# Altium footprint library ICs And Semiconductors THD.PcbLib: 350 footprints (part 3 of 22)
Each footprint in its own frame and in the unit in brackets; x right, y up, seen from the top. Pads: shape width x height; smd on the part's side, far side on the other; paste and mask are expansions set on the pad; w line width, h text height; cw(c..) or ccw(c..) is an arc to the next point about the centre after c.
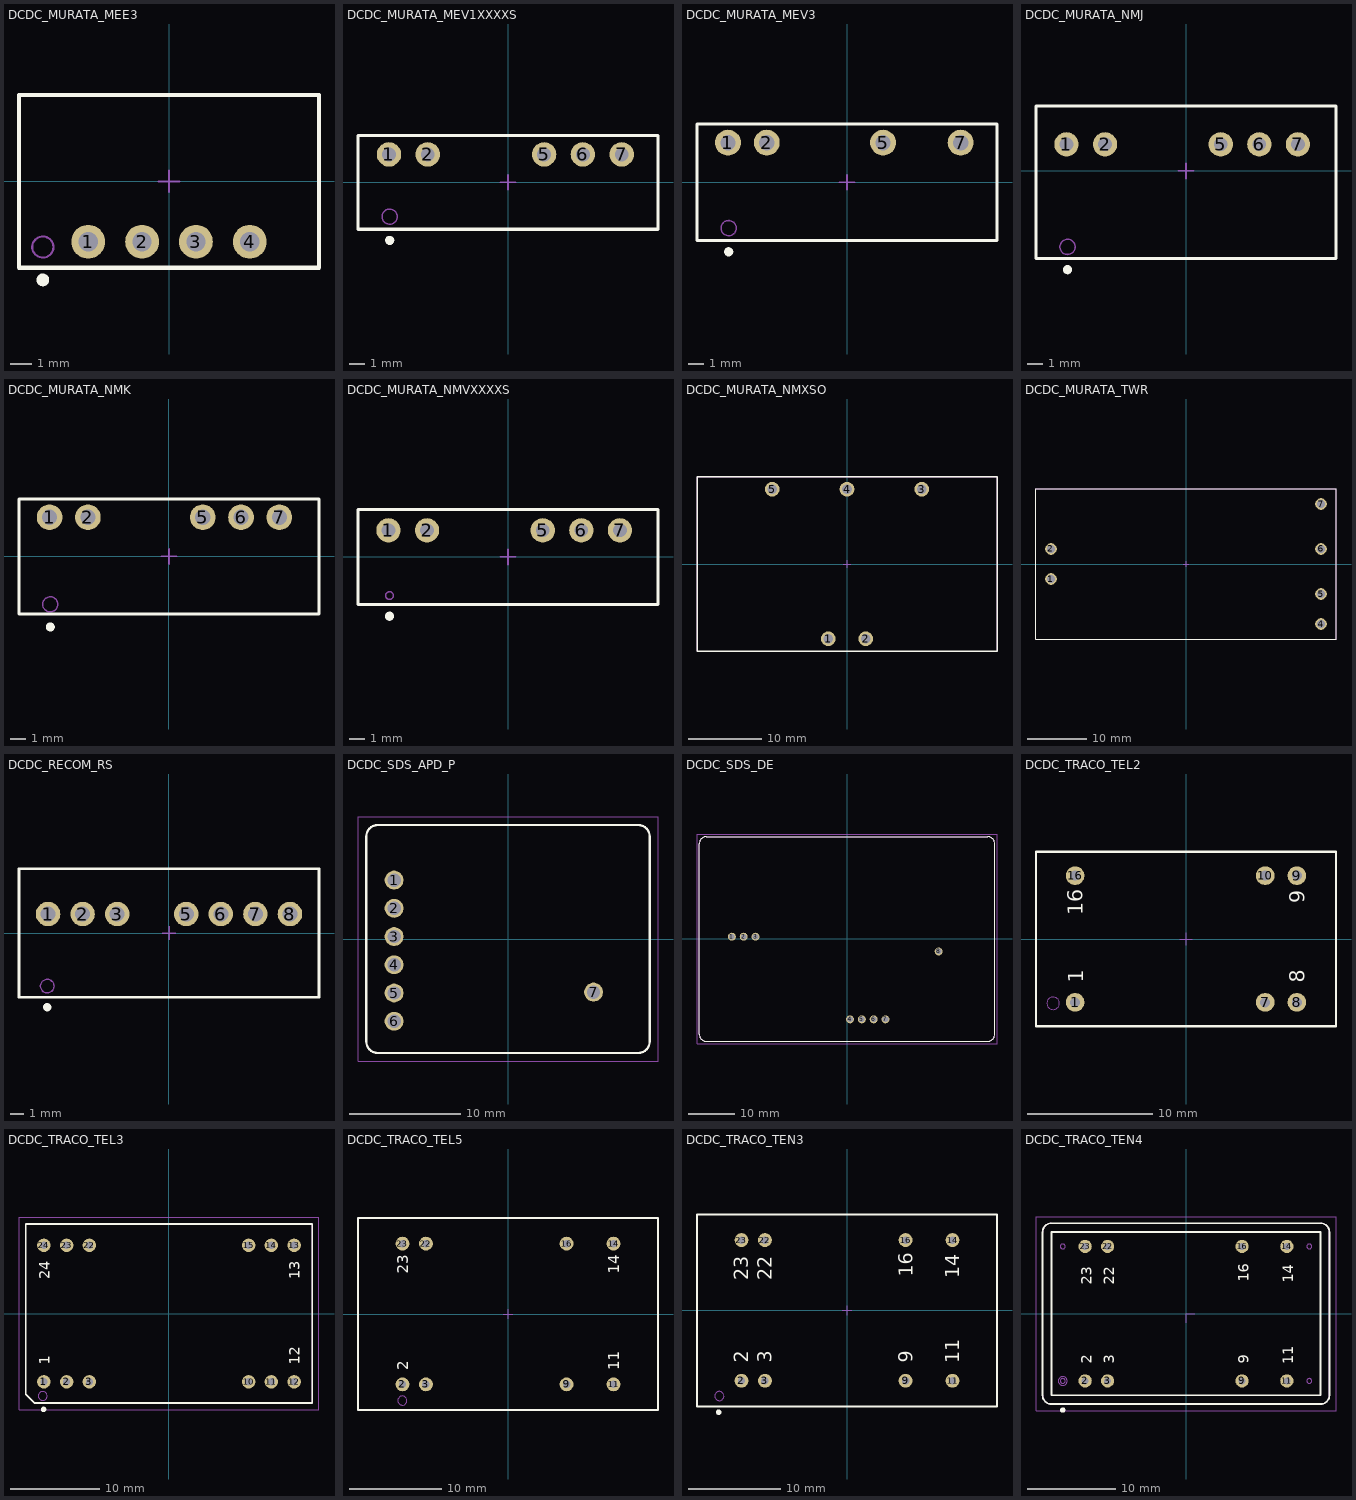
[diagram p2: the footprints below, top view; thin cyan lines are the x and y axes]

## DCDC_MURATA_MEE3 [mm] "MEE3 Series , Body 14.15 x 8.15mm, SIP Package"
height 10.15
pads (4):
  round 1.6 hole 0.9: 1(-3.81,-2.85) 2(-1.27,-2.85) 3(1.27,-2.85) 4(3.81,-2.85)
Top Overlay:
  circle w0.3: c-5.95,-4.65 r0.15
  lines w0.2: -7.075,-4.075 -7.075,4.075 7.075,4.075 7.075,-4.075 -7.075,-4.075
Notvisible:
  lines w0.1: -4.31,-2.85 -3.81,-2.85 ; -3.81,-3.35 -3.81,-2.85 ; -3.81,-2.35 -3.81,-2.85 ; -3.31,-2.85 -3.81,-2.85 ; -1.77,-2.85 -1.27,-2.85 ; -1.27,-3.35 -1.27,-2.85 ; -1.27,-2.35 -1.27,-2.85 ; -0.77,-2.85 -1.27,-2.85 ; -0.5,0 0,0 ; 0,-0.5 0,0 ; 0,0.5 0,0 ; 0.5,0 0,0 ; 0.77,-2.85 1.27,-2.85 ; 1.27,-3.35 1.27,-2.85 ; 1.27,-2.35 1.27,-2.85 ; 1.77,-2.85 1.27,-2.85 ; 3.31,-2.85 3.81,-2.85 ; 3.81,-3.35 3.81,-2.85 ; 3.81,-2.35 3.81,-2.85 ; 4.31,-2.85 3.81,-2.85
Mechanical 14:
  circle w0.1: c-5.95,-3.1 r0.5
  lines w0.1: -7.075,-4.075 -7.075,4.075 7.075,4.075 7.075,-4.075 -7.075,-4.075
3D body "DCDC_MURATA_MEE3.stp": height 10.25, standoff -3.2, extent -7.075,-4.075 7.075,4.075

## DCDC_MURATA_MEV1XXXXS [mm] "MEV1 Series , Body 19.65 x 6.15mm, SIP-7"
height 10.15
pads (5):
  round 1.6 hole 0.9: 1(-7.795,1.825) 2(-5.255,1.825) 5(2.365,1.825) 6(4.905,1.825) 7(7.445,1.825)
Top Overlay:
  circle w0.3: c-7.75,-3.8 r0.15
  lines w0.2: -9.825,-3.075 9.825,-3.075 9.825,3.075 -9.825,3.075 -9.825,-3.075
Notvisible:
  lines w0.1: -8.295,1.825 -7.795,1.825 ; -7.795,1.325 -7.795,1.825 ; -7.795,2.325 -7.795,1.825 ; -7.295,1.825 -7.795,1.825 ; -5.755,1.825 -5.255,1.825 ; -5.255,1.325 -5.255,1.825 ; -5.255,2.325 -5.255,1.825 ; -4.755,1.825 -5.255,1.825 ; -0.5,0 0,0 ; 0,-0.5 0,0 ; 0,0.5 0,0 ; 0.5,0 0,0 ; 1.865,1.825 2.365,1.825 ; 2.365,1.325 2.365,1.825 ; 2.365,2.325 2.365,1.825 ; 2.865,1.825 2.365,1.825 ; 4.405,1.825 4.905,1.825 ; 4.905,1.325 4.905,1.825 ; 4.905,2.325 4.905,1.825 ; 5.405,1.825 4.905,1.825 ; 6.945,1.825 7.445,1.825 ; 7.445,1.325 7.445,1.825 ; 7.445,2.325 7.445,1.825 ; 7.945,1.825 7.445,1.825
Mechanical 14:
  circle w0.1: c-7.75,-2.25 r0.5
  lines w0.1: -9.825,-3.075 9.825,-3.075 9.825,3.075 -9.825,3.075 -9.825,-3.075
3D body "DCDC_MURATA_MEV1XXXXS.stp": height 10.15, standoff -3.6, extent -9.825,-3.075 9.825,3.075

## DCDC_MURATA_MEV3 [mm] "MEV3S Series , Body 19.65 x 7.65mm, SIP-7"
height 10.15
pads (4):
  round 1.7 hole 1: 1(-7.795,2.6) 2(-5.255,2.6) 5(2.365,2.6) 7(7.445,2.6)
Top Overlay:
  circle w0.3: c-7.75,-4.55 r0.15
  lines w0.2: -9.825,-3.825 -9.825,3.825 9.825,3.825 9.825,-3.825 -9.825,-3.825
Notvisible:
  lines w0.1: -8.295,2.6 -7.795,2.6 ; -7.795,2.1 -7.795,2.6 ; -7.795,3.1 -7.795,2.6 ; -7.295,2.6 -7.795,2.6 ; -5.755,2.6 -5.255,2.6 ; -5.255,2.1 -5.255,2.6 ; -5.255,3.1 -5.255,2.6 ; -4.755,2.6 -5.255,2.6 ; -0.5,0 0,0 ; 0,-0.5 0,0 ; 0,0.5 0,0 ; 0.5,0 0,0 ; 1.865,2.6 2.365,2.6 ; 2.365,2.1 2.365,2.6 ; 2.365,3.1 2.365,2.6 ; 2.865,2.6 2.365,2.6 ; 6.945,2.6 7.445,2.6 ; 7.445,2.1 7.445,2.6 ; 7.445,3.1 7.445,2.6 ; 7.945,2.6 7.445,2.6
Mechanical 14:
  circle w0.1: c-7.75,-3 r0.5
  lines w0.1: -9.825,-3.825 -9.825,3.825 9.825,3.825 9.825,-3.825 -9.825,-3.825
3D body "DCDC_MURATA_MEV3.stp": height 10.15, standoff -3.6, extent -9.825,-3.825 9.825,3.825

## DCDC_MURATA_NMJ [mm] "NMJ Series , Body 19.5 x 9.8mm, SIP-7"
height 12.5
pads (5):
  round 1.6 hole 0.9: 1(-7.87,1.75) 2(-5.33,1.75) 5(2.29,1.75) 6(4.83,1.75) 7(7.37,1.75)
Top Overlay:
  circle w0.3: c-7.8,-6.5 r0.15
  lines w0.2: -9.875,-5.775 9.875,-5.775 9.875,4.275 -9.875,4.275 -9.875,-5.775
Notvisible:
  lines w0.1: -8.37,1.75 -7.87,1.75 ; -7.87,1.25 -7.87,1.75 ; -7.87,2.25 -7.87,1.75 ; -7.37,1.75 -7.87,1.75 ; -5.83,1.75 -5.33,1.75 ; -5.33,1.25 -5.33,1.75 ; -5.33,2.25 -5.33,1.75 ; -4.83,1.75 -5.33,1.75 ; -0.5,0 0,0 ; 0,-0.5 0,0 ; 0,0.5 0,0 ; 0.5,0 0,0 ; 1.79,1.75 2.29,1.75 ; 2.29,1.25 2.29,1.75 ; 2.29,2.25 2.29,1.75 ; 2.79,1.75 2.29,1.75 ; 4.33,1.75 4.83,1.75 ; 4.83,1.25 4.83,1.75 ; 4.83,2.25 4.83,1.75 ; 5.33,1.75 4.83,1.75 ; 6.87,1.75 7.37,1.75 ; 7.37,1.25 7.37,1.75 ; 7.37,2.25 7.37,1.75 ; 7.87,1.75 7.37,1.75
Mechanical 14:
  circle w0.1: c-7.8,-5 r0.5
  lines w0.1: -9.875,-5.775 9.875,-5.775 9.875,4.275 -9.875,4.275 -9.875,-5.775
3D body "DCDC_MURATA_NMJ.stp": height 12.75, standoff -3.75, extent -9.875,-5.775 9.875,4.275

## DCDC_MURATA_NMK [mm] "NMK Series , Body 19.65 x 7.65mm, SIP-7"
height 10.15
pads (5):
  round 1.7 hole 1: 1(-7.92,2.6) 2(-5.38,2.6) 5(2.24,2.6) 6(4.78,2.6) 7(7.32,2.6)
Top Overlay:
  circle w0.3: c-7.875,-4.675 r0.15
  lines w0.2: -9.95,-3.825 9.95,-3.825 9.95,3.825 -9.95,3.825 -9.95,-3.825
Notvisible:
  lines w0.1: -8.42,2.6 -7.92,2.6 ; -7.92,2.1 -7.92,2.6 ; -7.92,3.1 -7.92,2.6 ; -7.42,2.6 -7.92,2.6 ; -5.88,2.6 -5.38,2.6 ; -5.38,2.1 -5.38,2.6 ; -5.38,3.1 -5.38,2.6 ; -4.88,2.6 -5.38,2.6 ; -0.5,0 0,0 ; 0,-0.5 0,0 ; 0,0.5 0,0 ; 0.5,0 0,0 ; 1.74,2.6 2.24,2.6 ; 2.24,2.1 2.24,2.6 ; 2.24,3.1 2.24,2.6 ; 2.74,2.6 2.24,2.6 ; 4.28,2.6 4.78,2.6 ; 4.78,2.1 4.78,2.6 ; 4.78,3.1 4.78,2.6 ; 5.28,2.6 4.78,2.6 ; 6.82,2.6 7.32,2.6 ; 7.32,2.1 7.32,2.6 ; 7.32,3.1 7.32,2.6 ; 7.82,2.6 7.32,2.6
Mechanical 14:
  circle w0.1: c-7.875,-3.175 r0.5
  lines w0.1: -9.95,-3.825 9.95,-3.825 9.95,3.825 -9.95,3.825 -9.95,-3.825
3D body "DCDC_MURATA_NMK.stp": height 10.15, standoff -3.6, extent -9.95,-3.825 9.95,3.825

## DCDC_MURATA_NMVXXXXS [mm] "NMV Series , Body 19.5 x 6mm, SIP-7"
height 10.25
pads (5):
  round 1.6 hole 0.9: 1(-7.87,1.75) 2(-5.33,1.75) 5(2.29,1.75) 6(4.83,1.75) 7(7.37,1.75)
Top Overlay:
  circle w0.3: c-7.8,-3.9 r0.15
  lines w0.2: -9.875,-3.125 -9.875,3.125 9.875,3.125 9.875,-3.125 -9.875,-3.125
Notvisible:
  lines w0.1: -8.37,1.75 -7.87,1.75 ; -7.87,1.25 -7.87,1.75 ; -7.87,2.25 -7.87,1.75 ; -7.37,1.75 -7.87,1.75 ; -5.83,1.75 -5.33,1.75 ; -5.33,1.25 -5.33,1.75 ; -5.33,2.25 -5.33,1.75 ; -4.83,1.75 -5.33,1.75 ; -0.5,0 0,0 ; 0,-0.5 0,0 ; 0,0.5 0,0 ; 0.5,0 0,0 ; 1.79,1.75 2.29,1.75 ; 2.29,1.25 2.29,1.75 ; 2.29,2.25 2.29,1.75 ; 2.79,1.75 2.29,1.75 ; 4.33,1.75 4.83,1.75 ; 4.83,1.25 4.83,1.75 ; 4.83,2.25 4.83,1.75 ; 5.33,1.75 4.83,1.75 ; 6.87,1.75 7.37,1.75 ; 7.37,1.25 7.37,1.75 ; 7.37,2.25 7.37,1.75 ; 7.87,1.75 7.37,1.75
Mechanical 14:
  circle w0.1: c-7.8,-2.54 r0.254
  lines w0.1: -9.875,-3.125 9.875,-3.125 9.875,3.125 -9.875,3.125 -9.875,-3.125
3D body "DCDC_MURATA_NMVXXXXS.stp": height 10.25, standoff -3.75, extent -9.875,-3.125 9.875,3.125

## DCDC_MURATA_NMXSO [mm] "NMXSO Series , Body 40.5x23.5mm, Height 10mm"
height 10.25
pads (5):
  round 2 hole 1.3: 1(-2.54,-10.16) 2(2.54,-10.16) 3(10.16,10.16) 4(0,10.16) 5(-10.16,10.16)
Top Overlay:
  lines w0.2: -20.375,-11.875 -20.375,11.875 20.375,11.875 20.375,-11.875 -20.375,-11.875
Notvisible:
  lines w0.1: -10.66,10.16 -10.16,10.16 ; -10.16,9.66 -10.16,10.16 ; -10.16,10.66 -10.16,10.16 ; -9.66,10.16 -10.16,10.16 ; -3.04,-10.16 -2.54,-10.16 ; -2.54,-10.66 -2.54,-10.16 ; -2.54,-9.66 -2.54,-10.16 ; -2.04,-10.16 -2.54,-10.16 ; -0.5,0 0,0 ; -0.5,10.16 0,10.16 ; 0,-0.5 0,0 ; 0,0.5 0,0 ; 0,9.66 0,10.16 ; 0,10.66 0,10.16 ; 0.5,0 0,0 ; 0.5,10.16 0,10.16 ; 2.04,-10.16 2.54,-10.16 ; 2.54,-10.66 2.54,-10.16 ; 2.54,-9.66 2.54,-10.16 ; 3.04,-10.16 2.54,-10.16 ; 9.66,10.16 10.16,10.16 ; 10.16,9.66 10.16,10.16 ; 10.16,10.66 10.16,10.16 ; 10.66,10.16 10.16,10.16
Mechanical 14:
  lines w0.1: -20.375,-11.875 -20.375,11.875 20.375,11.875 20.375,-11.875 -20.375,-11.875
3D body "DCDC_MURATA_NMXSO.stp": height 10.25, standoff -3.5, extent -20.375,-11.875 20.375,11.875

## DCDC_MURATA_TWR [mm] "TWR Series , Body 50.08 x 25.4mm, Height 9.53mm"
height 9.53
pads (6):
  round 2 hole 1.3: 1(-22.86,-2.54) 2(-22.86,2.54) 4(22.86,-10.16) 5(22.86,-5.08) 6(22.86,2.54) 7(22.86,10.16)
Top Overlay:
  lines w0.2: -25.4,-12.7 -25.4,12.7 25.4,12.7 25.4,-12.7 -25.4,-12.7
Notvisible:
  lines w0.1: -23.36,-2.54 -22.86,-2.54 ; -23.36,2.54 -22.86,2.54 ; -22.86,-3.04 -22.86,-2.54 ; -22.86,-2.04 -22.86,-2.54 ; -22.86,2.04 -22.86,2.54 ; -22.86,3.04 -22.86,2.54 ; -22.36,-2.54 -22.86,-2.54 ; -22.36,2.54 -22.86,2.54 ; -0.5,0 0,0 ; 0,-0.5 0,0 ; 0,0.5 0,0 ; 0.5,0 0,0 ; 22.36,-10.16 22.86,-10.16 ; 22.36,-5.08 22.86,-5.08 ; 22.36,2.54 22.86,2.54 ; 22.36,10.16 22.86,10.16 ; 22.86,-10.66 22.86,-10.16 ; 22.86,-9.66 22.86,-10.16 ; 22.86,-5.58 22.86,-5.08 ; 22.86,-4.58 22.86,-5.08 ; 22.86,2.04 22.86,2.54 ; 22.86,3.04 22.86,2.54 ; 22.86,9.66 22.86,10.16 ; 22.86,10.66 22.86,10.16 ; 23.36,-10.16 22.86,-10.16 ; 23.36,-5.08 22.86,-5.08 ; 23.36,2.54 22.86,2.54 ; 23.36,10.16 22.86,10.16
Mechanical 14:
  lines w0.1: -25.4,-12.7 -25.4,12.7 25.4,12.7 25.4,-12.7 -25.4,-12.7
3D body "DC-DC_MURATA_TWR.stp": height 9.53, standoff -3.8, extent -25.4,-12.7 25.4,12.7

## DCDC_RECOM_RS [mm] "RS Series , Body 21.8x9.2mm, Compact SIP-8 Package"
height 11.35
pads (7):
  round 1.8 hole 1.1: 1(-8.89,1.4) 2(-6.35,1.4) 3(-3.81,1.4) 5(1.27,1.4) 6(3.81,1.4) 7(6.35,1.4) 8(8.89,1.4)
Top Overlay:
  circle w0.3: c-8.95,-5.45 r0.15
  lines w0.2: -11.025,-4.725 -11.025,4.725 11.025,4.725 11.025,-4.725 -11.025,-4.725
Notvisible:
  lines w0.1: -9.39,1.4 -8.89,1.4 ; -8.89,0.9 -8.89,1.4 ; -8.89,1.9 -8.89,1.4 ; -8.39,1.4 -8.89,1.4 ; -6.85,1.4 -6.35,1.4 ; -6.35,0.9 -6.35,1.4 ; -6.35,1.9 -6.35,1.4 ; -5.85,1.4 -6.35,1.4 ; -4.31,1.4 -3.81,1.4 ; -3.81,0.9 -3.81,1.4 ; -3.81,1.9 -3.81,1.4 ; -3.31,1.4 -3.81,1.4 ; -0.5,0 0,0 ; 0,-0.5 0,0 ; 0,0.5 0,0 ; 0.5,0 0,0 ; 0.77,1.4 1.27,1.4 ; 1.27,0.9 1.27,1.4 ; 1.27,1.9 1.27,1.4 ; 1.77,1.4 1.27,1.4 ; 3.31,1.4 3.81,1.4 ; 3.81,0.9 3.81,1.4 ; 3.81,1.9 3.81,1.4 ; 4.31,1.4 3.81,1.4 ; 5.85,1.4 6.35,1.4 ; 6.35,0.9 6.35,1.4 ; 6.35,1.9 6.35,1.4 ; 6.85,1.4 6.35,1.4 ; 8.39,1.4 8.89,1.4 ; 8.89,0.9 8.89,1.4 ; 8.89,1.9 8.89,1.4 ; 9.39,1.4 8.89,1.4
Mechanical 14:
  circle w0.1: c-8.95,-3.9 r0.5
  lines w0.1: -11.025,-4.725 -11.025,4.725 11.025,4.725 11.025,-4.725 -11.025,-4.725
3D body "DCDC_RECOM_RS.stp": height 11.35, standoff -3.6, extent -11.025,-4.725 11.025,4.725

## DCDC_SDS_APD_P [mm] "ADP Series , Body 25.5x20.5mm, high voltage DC-DC converter"
height 11
pads (7):
  round 1.7 hole 1.2: 1(-10.25,5.3) 2(-10.25,2.76) 3(-10.25,0.22) 4(-10.25,-2.32) 5(-10.25,-4.86) 6(-10.25,-7.4) 7(7.7,-4.78)
Top Overlay:
  lines w0.2: -12.75,-9.25 ccw(c-11.75,-9.25) -11.75,-10.25 11.75,-10.25 ccw(c11.75,-9.25) 12.75,-9.25 12.75,9.25 ccw(c11.75,9.25) 11.75,10.25 -11.75,10.25 ccw(c-11.75,9.25) -12.75,9.25 -12.75,-9.25
Mechanical 14:
  lines w0.1: -12.75,-9.25 ccw(c-11.75,-9.25) -11.75,-10.25 11.75,-10.25 ccw(c11.75,-9.25) 12.75,-9.25 12.75,9.25 ccw(c11.75,9.25) 11.75,10.25 -11.75,10.25 ccw(c-11.75,9.25) -12.75,9.25 -12.75,-9.25
Mechanical 15:
  lines w0.05: -13.5,-11 13.5,-11 13.5,11 -13.5,11 -13.5,-11
3D body "DCDC_SDS_APD_P.stp": height 11, standoff -3.6, extent -12.75,-10.25 12.75,10.25

## DCDC_SDS_DE [mm] "DE Series , Body 63.5x44mm, high voltage DC-DC converter"
height 17.5
pads (8):
  round 1.7 hole 1.2: 1(-24.75,0.5) 2(-22.21,0.5) 3(-19.67,0.5) 4(0.65,-17.28) 5(3.19,-17.28) 6(5.73,-17.28) 7(8.27,-17.28) 8(19.7,-2.675)
Top Overlay:
  lines w0.2: -31.75,-20.5 ccw(c-30.25,-20.5) -30.25,-22 30.25,-22 ccw(c30.25,-20.5) 31.75,-20.5 31.75,20.5 ccw(c30.25,20.5) 30.25,22 -30.25,22 ccw(c-30.25,20.5) -31.75,20.5 -31.75,-20.5
Mechanical 14:
  lines w0.1: -31.75,-20.5 ccw(c-30.25,-20.5) -30.25,-22 30.25,-22 ccw(c30.25,-20.5) 31.75,-20.5 31.75,20.5 ccw(c30.25,20.5) 30.25,22 -30.25,22 ccw(c-30.25,20.5) -31.75,20.5 -31.75,-20.5
Mechanical 15:
  lines w0.05: -32.25,-22.5 -32.25,22.5 32.25,22.5 32.25,-22.5 -32.25,-22.5
3D body "DCDC_SDS_DE.stp": height 17.5, standoff -3.6, extent -31.75,-22 31.75,22

## DCDC_TRACO_TEL2 [mm] "TEL2 Series , Body 23.8x13.7mm, Pitch 2.54mm"
height 7.87
pads (6):
  round 1.5 hole 0.8: 1(-8.89,-5.08) 7(6.35,-5.08) 8(8.89,-5.08) 9(8.89,5.08) 10(6.35,5.08) 16(-8.89,5.08)
Top Overlay:
  lines w0.2: -12.025,-6.975 12.025,-6.975 12.025,6.975 -12.025,6.975 -12.025,-6.975
  text "1" at -8.255,-3.5 h1.2
  text "16" at -8.28,1.895 h1.2
  text "9" at 9.525,2.87 h1.2
  text "8" at 9.525,-3.5 h1.2
Notvisible:
  lines w0.1: -9.39,-5.08 -8.89,-5.08 ; -9.39,5.08 -8.89,5.08 ; -8.89,-5.58 -8.89,-5.08 ; -8.89,-4.58 -8.89,-5.08 ; -8.89,4.58 -8.89,5.08 ; -8.89,5.58 -8.89,5.08 ; -8.39,-5.08 -8.89,-5.08 ; -8.39,5.08 -8.89,5.08 ; -0.5,0 0,0 ; 0,-0.5 0,0 ; 0,0.5 0,0 ; 0.5,0 0,0 ; 5.85,-5.08 6.35,-5.08 ; 5.85,5.08 6.35,5.08 ; 6.35,-5.58 6.35,-5.08 ; 6.35,-4.58 6.35,-5.08 ; 6.35,4.58 6.35,5.08 ; 6.35,5.58 6.35,5.08 ; 6.85,-5.08 6.35,-5.08 ; 6.85,5.08 6.35,5.08 ; 8.39,-5.08 8.89,-5.08 ; 8.39,5.08 8.89,5.08 ; 8.89,-5.58 8.89,-5.08 ; 8.89,-4.58 8.89,-5.08 ; 8.89,4.58 8.89,5.08 ; 8.89,5.58 8.89,5.08 ; 9.39,-5.08 8.89,-5.08 ; 9.39,5.08 8.89,5.08
Mechanical 14:
  circle w0.1: c-10.65,-5.155 r0.5
  lines w0.1: -12.025,-6.975 12.025,-6.975 12.025,6.975 -12.025,6.975 -12.025,-6.975
  text "1" at -8.255,-3.5 h1.2
  text "16" at -8.28,1.895 h1.2
  text "9" at 9.525,2.87 h1.2
  text "8" at 9.525,-3.5 h1.2
3D body "DCDC_TRACO_TEL2.stp": height 7.87, standoff -3.2, extent -12.025,-6.975 12.025,6.975

## DCDC_TRACO_TEL3 [mm] "TEL3 Series , Body 32x20mm, Pitch 2.54mm"
height 10.7
pads (12):
  round 1.5 hole 0.8: 1(-13.97,-7.62) 2(-11.43,-7.62) 3(-8.89,-7.62) 10(8.89,-7.62) 11(11.43,-7.62) 12(13.97,-7.62) 13(13.97,7.62) 14(11.43,7.62) 15(8.89,7.62) 22(-8.89,7.62) 23(-11.43,7.62) 24(-13.97,7.62)
Top Overlay:
  circle w0.3: c-14,-10.7 r0.15
  lines w0.2: -16,-9 -16,10 16,10 16,-10 -15,-10 -16,-9
  text "1" at -13.335,-5.715 h1.2
  text "13" at 14.605,3.81 h1.2
  text "24" at -13.335,3.81 h1.2
  text "12" at 14.605,-5.715 h1.2
Mechanical 14:
  circle w0.1: c-14.095,-9.205 r0.5
  lines w0.1: -16,-9 -16,10 16,10 16,-10 -15,-10 -16,-9
  text "1" at -13.335,-5.715 h1.2
  text "12" at 14.605,-5.715 h1.2
  text "13" at 14.605,3.81 h1.2
  text "24" at -13.335,3.81 h1.2
Mechanical 15:
  lines w0.05: -16.75,-10.75 16.75,-10.75 16.75,10.75 -16.75,10.75 -16.75,-10.75
3D body "DCDC_TRACO_TEL3.stp": height 10.7, standoff -3.8, extent -16,-10 16,10

## DCDC_TRACO_TEL5 [mm] "TEL5 Series , Body 32x20.3mm"
height 10.7
pads (8):
  round 1.5 hole 0.8: 2(-11.43,-7.62) 3(-8.89,-7.62) 9(6.35,-7.62) 11(11.43,-7.62) 14(11.43,7.62) 16(6.35,7.62) 22(-8.89,7.62) 23(-11.43,7.62)
Top Overlay:
  lines w0.2: -16.25,-10.4 16.25,-10.4 16.25,10.4 -16.25,10.4 -16.25,-10.4
  text "11" at 12.04,-6.09 h1.2
  text "23" at -10.795,4.335 h1.2
  text "14" at 12.065,4.335 h1.2
  text "2" at -10.82,-6.09 h1.2
Notvisible:
  lines w0.1: -11.93,-7.62 -11.43,-7.62 ; -11.93,7.62 -11.43,7.62 ; -11.43,-8.12 -11.43,-7.62 ; -11.43,-7.12 -11.43,-7.62 ; -11.43,7.12 -11.43,7.62 ; -11.43,8.12 -11.43,7.62 ; -10.93,-7.62 -11.43,-7.62 ; -10.93,7.62 -11.43,7.62 ; -9.39,-7.62 -8.89,-7.62 ; -9.39,7.62 -8.89,7.62 ; -8.89,-8.12 -8.89,-7.62 ; -8.89,-7.12 -8.89,-7.62 ; -8.89,7.12 -8.89,7.62 ; -8.89,8.12 -8.89,7.62 ; -8.39,-7.62 -8.89,-7.62 ; -8.39,7.62 -8.89,7.62 ; -0.5,0 0,0 ; 0,-0.5 0,0 ; 0,0.5 0,0 ; 0.5,0 0,0 ; 5.85,-7.62 6.35,-7.62 ; 5.85,7.62 6.35,7.62 ; 6.35,-8.12 6.35,-7.62 ; 6.35,-7.12 6.35,-7.62 ; 6.35,7.12 6.35,7.62 ; 6.35,8.12 6.35,7.62 ; 6.85,-7.62 6.35,-7.62 ; 6.85,7.62 6.35,7.62 ; 10.93,-7.62 11.43,-7.62 ; 10.93,7.62 11.43,7.62 ; 11.43,-8.12 11.43,-7.62 ; 11.43,-7.12 11.43,-7.62 ; 11.43,7.12 11.43,7.62 ; 11.43,8.12 11.43,7.62 ; 11.93,-7.62 11.43,-7.62 ; 11.93,7.62 11.43,7.62
Mechanical 14:
  circle w0.1: c-11.445,-9.38 r0.5
  lines w0.1: -16.25,-10.4 16.25,-10.4 16.25,10.4 -16.25,10.4 -16.25,-10.4
  text "23" at -10.795,4.335 h1.2
  text "14" at 12.065,4.335 h1.2
  text "11" at 12.04,-6.09 h1.2
  text "2" at -10.82,-6.09 h1.2
3D body "DCDC_TRACO_TEL5.stp": height 10.7, standoff -3.6, extent -16.25,-10.4 16.25,10.4

## DCDC_TRACO_TEN3 [mm] "TEN 3 Series , Body 32x20.3mm"
height 10.7
pads (8):
  round 1.5 hole 0.8: 2(-11.43,-7.62) 3(-8.89,-7.62) 9(6.35,-7.62) 11(11.43,-7.62) 14(11.43,7.62) 16(6.35,7.62) 22(-8.89,7.62) 23(-11.43,7.62)
Top Overlay:
  circle w0.3: c-13.9,-11.025 r0.15
  lines w0.2: -16.25,-10.4 -16.25,10.4 16.25,10.4 16.25,-10.4 -16.25,-10.4
  text "16" at 7.1,3.632 h1.5
  text "14" at 12.18,3.505 h1.5
  text "22" at -8.14,3.251 h1.5
  text "23" at -10.68,3.251 h1.5
  text "9" at 7.1,-5.663 h1.5
  text "11" at 12.18,-5.737 h1.5
  text "3" at -8.14,-5.663 h1.5
  text "2" at -10.68,-5.663 h1.5
Notvisible:
  lines w0.1: -11.93,-7.62 -11.43,-7.62 ; -11.93,7.62 -11.43,7.62 ; -11.43,-8.12 -11.43,-7.62 ; -11.43,-7.12 -11.43,-7.62 ; -11.43,7.12 -11.43,7.62 ; -11.43,8.12 -11.43,7.62 ; -10.93,-7.62 -11.43,-7.62 ; -10.93,7.62 -11.43,7.62 ; -9.39,-7.62 -8.89,-7.62 ; -9.39,7.62 -8.89,7.62 ; -8.89,-8.12 -8.89,-7.62 ; -8.89,-7.12 -8.89,-7.62 ; -8.89,7.12 -8.89,7.62 ; -8.89,8.12 -8.89,7.62 ; -8.39,-7.62 -8.89,-7.62 ; -8.39,7.62 -8.89,7.62 ; -0.5,0 0,0 ; 0,-0.5 0,0 ; 0,0.5 0,0 ; 0.5,0 0,0 ; 5.85,-7.62 6.35,-7.62 ; 5.85,7.62 6.35,7.62 ; 6.35,-8.12 6.35,-7.62 ; 6.35,-7.12 6.35,-7.62 ; 6.35,7.12 6.35,7.62 ; 6.35,8.12 6.35,7.62 ; 6.85,-7.62 6.35,-7.62 ; 6.85,7.62 6.35,7.62 ; 10.93,-7.62 11.43,-7.62 ; 10.93,7.62 11.43,7.62 ; 11.43,-8.12 11.43,-7.62 ; 11.43,-7.12 11.43,-7.62 ; 11.43,7.12 11.43,7.62 ; 11.43,8.12 11.43,7.62 ; 11.93,-7.62 11.43,-7.62 ; 11.93,7.62 11.43,7.62
Mechanical 14:
  circle w0.1: c-13.825,-9.275 r0.5
  lines w0.1: -16.25,-10.4 -16.25,10.4 16.25,10.4 16.25,-10.4 -16.25,-10.4
  text "2" at -10.68,-5.663 h1.5
  text "3" at -8.14,-5.663 h1.5
  text "11" at 12.18,-5.737 h1.5
  text "9" at 7.1,-5.663 h1.5
  text "23" at -10.68,3.251 h1.5
  text "22" at -8.14,3.251 h1.5
  text "14" at 12.18,3.505 h1.5
  text "16" at 7.1,3.632 h1.5
3D body "DCDC_TRACO_TEN3.stp": height 12.7, standoff -3.8, extent -16.25,-10.4 16.25,10.4

## DCDC_TRACO_TEN4 [mm] "TEN 4 Series , Body 32.5x20.8mm, DIP-24 Package with Standard Pinout"
height 10.5
pads (8):
  round 1.5 hole 0.8: 2(-11.43,-7.62) 3(-8.89,-7.62) 9(6.35,-7.62) 11(11.43,-7.62) 14(11.43,7.62) 16(6.35,7.62) 22(-8.89,7.62) 23(-11.43,7.62)
Top Overlay:
  circle w0.3: c-13.97,-10.922 r0.15
  lines w0.2: -16.25,-9.25 ccw(c-15.25,-9.25) -15.25,-10.25 15.25,-10.25 ccw(c15.25,-9.25) 16.25,-9.25 16.25,9.25 ccw(c15.25,9.25) 15.25,10.25 -15.25,10.25 ccw(c-15.25,9.25) -16.25,9.25 -16.25,-9.25 ; -15.25,-9.25 15.25,-9.25 15.25,9.25 -15.25,9.25 -15.25,-9.25
  text "16" at 7.1,3.632 h1.2
  text "14" at 12.18,3.505 h1.2
  text "22" at -8.14,3.251 h1.2
  text "23" at -10.68,3.251 h1.2
  text "9" at 7.1,-5.663 h1.2
  text "11" at 12.18,-5.737 h1.2
  text "3" at -8.14,-5.663 h1.2
  text "2" at -10.68,-5.663 h1.2
Notvisible:
  circle w0.1: c13.97,7.62 r0.275
  circle w0.1: c13.97,-7.62 r0.275
  circle w0.1: c-13.97,7.62 r0.275
  circle w0.1: c-13.97,-7.62 r0.275
  lines w0.1: 0,-1 0,0 1,0
Mechanical 14:
  circle w0.1: c-13.97,-7.63 r0.5
  lines w0.1: -16.25,-9.25 ccw(c-15.25,-9.25) -15.25,-10.25 15.25,-10.25 ccw(c15.25,-9.25) 16.25,-9.25 16.25,9.25 ccw(c15.25,9.25) 15.25,10.25 -15.25,10.25 ccw(c-15.25,9.25) -16.25,9.25 -16.25,-9.25
  text "2" at -10.68,-5.663 h1.2
  text "3" at -8.14,-5.663 h1.2
  text "11" at 12.18,-5.737 h1.2
  text "9" at 7.1,-5.663 h1.2
  text "23" at -10.68,3.251 h1.2
  text "22" at -8.14,3.251 h1.2
  text "14" at 12.18,3.505 h1.2
  text "16" at 7.1,3.632 h1.2
Mechanical 15:
  lines w0.05: -17,-11 -17,11 17,11 17,-11 -17,-11
3D body "DCDC_TRACO_TEN4.stp": height 10.5, standoff -3.8, extent -16.25,-10.25 16.05,10.4